# Altium footprint library Connectors.PcbLib: 135 footprints (part 6 of 9)
Each footprint in its own frame and in the unit in brackets; x right, y up, seen from the top. Pads: shape width x height; smd on the part's side, far side on the other; paste and mask are expansions set on the pad; w line width, h text height; cw(c..) or ccw(c..) is an arc to the next point about the centre after c.
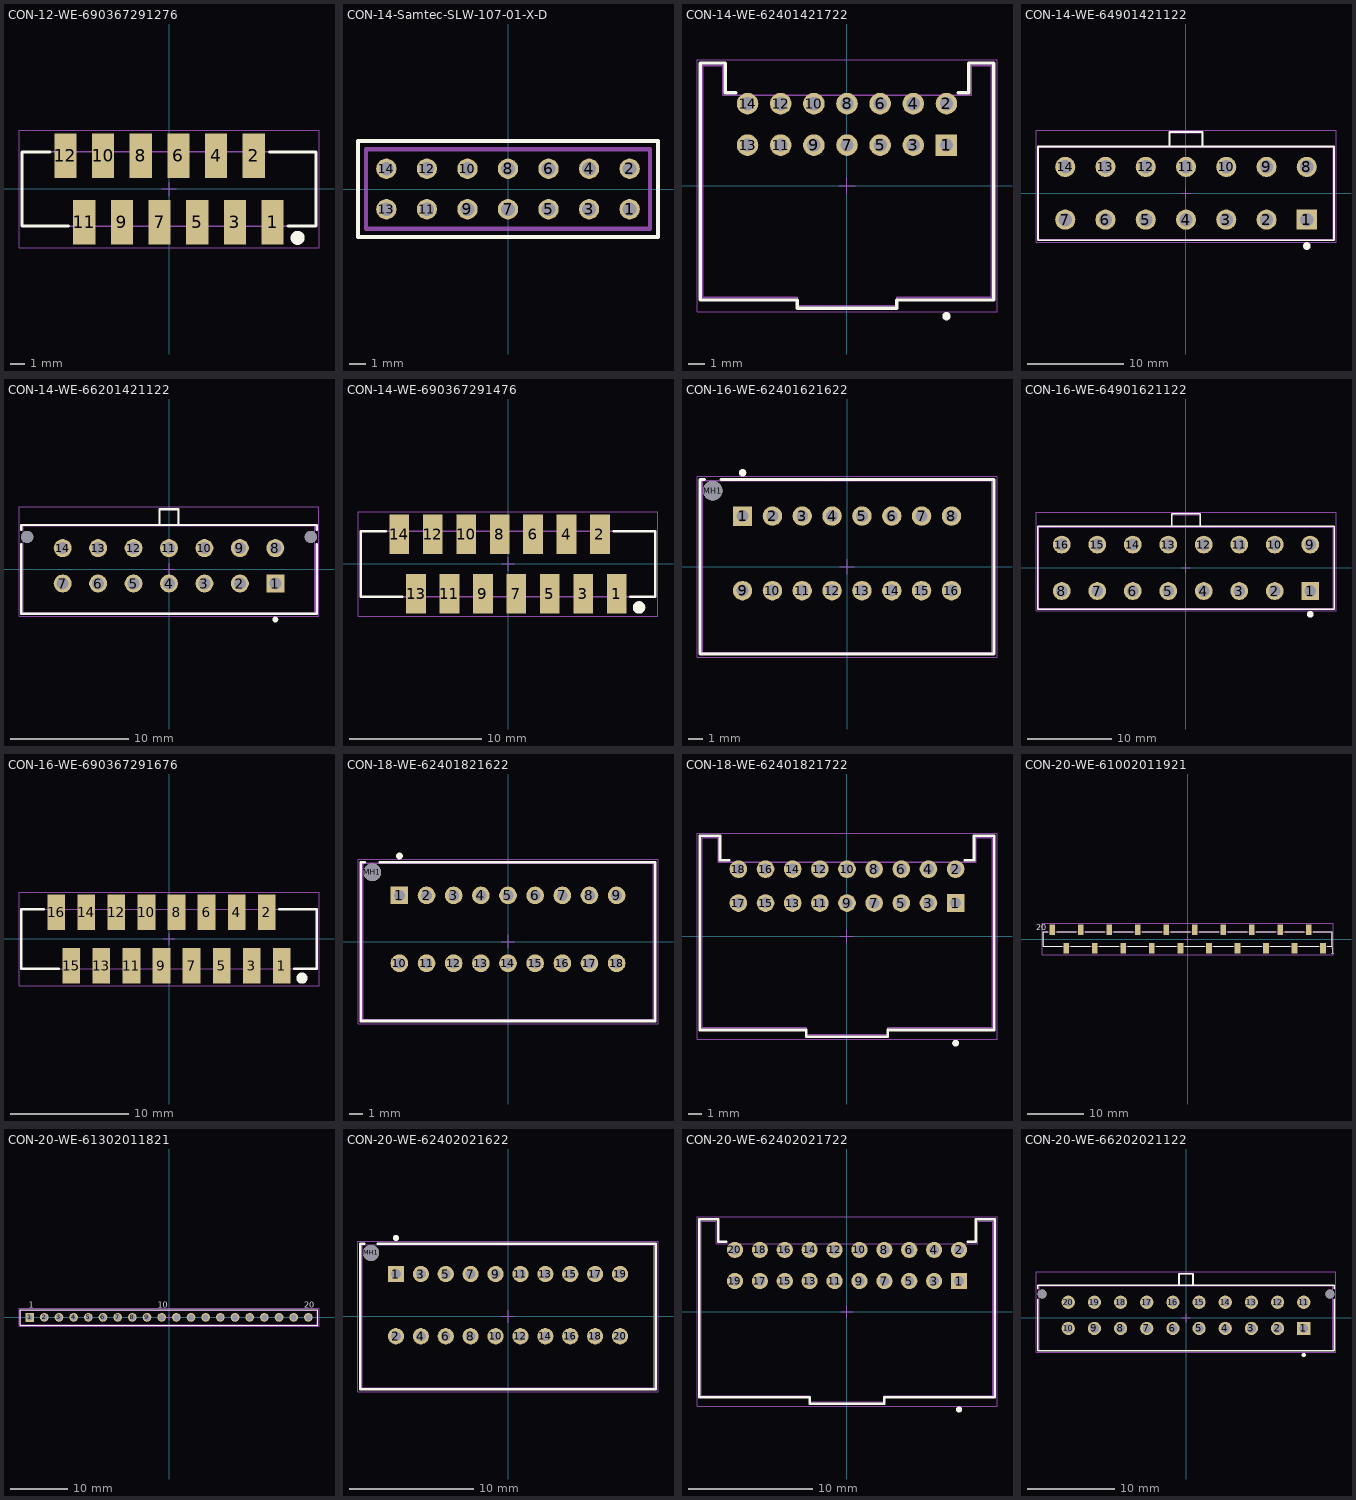
[diagram p5: the footprints below, top view; thin cyan lines are the x and y axes]

## CON-12-WE-690367291276 [mm] "MiniModule Connectors, PCB Type, Female, SMT, Vertical, 12p"
height 5.45
pads (12):
  rect 1.5x3 smd: 1(6.985,-2.25) 2(5.715,2.25) 3(4.445,-2.25) 4(3.175,2.25) 5(1.905,-2.25) 6(0.635,2.25) 7(-0.635,-2.25) 8(-1.905,2.25) 9(-3.175,-2.25) 10(-4.445,2.25) 11(-5.715,-2.25) 12(-6.985,2.25)
Top Overlay:
  circle w0.5: c8.68,-3.3 r0.224
  lines w0.2: -8.03,2.5 -9.92,2.5 -9.92,-2.5 -6.78,-2.5 ; 6.78,2.5 9.92,2.5 9.92,-2.5 8.03,-2.5
Top Component Center:
  lines w0.05: -0.5,0 0.5,0 ; 0,-0.5 0,0.5
Top Component Outline:
  lines w0.1: -9.92,-2.5 -9.92,2.5 9.92,2.5 9.92,-2.5 -9.92,-2.5
Top Courtyard (Mech26):
  lines w0.05: -10.12,-3.95 -10.12,3.95 10.12,3.95 10.12,-3.95 -10.12,-3.95
3D body "690367291276.stp": height 5.75, standoff 0, extent -9.915,-3.498 9.915,3.499

## CON-14-Samtec-SLW-107-01-X-D [mil]
pads (14):
  round 50 hole 34 mask+3: 1(300,-50) 2(300,50) 3(200,-50) 4(200,50) 5(100,-50) 6(100,50) 7(0,-50) 8(0,50) 9(-100,-50) 10(-100,50) 11(-200,-50) 12(-200,50) 13(-300,-50) 14(-300,50)
Top Overlay:
  lines w10: -370,-118 370,-118 370,118 -370,118 -370,-118
Top Component Outline:
  lines w10: -350,-98 -350,98 350,98 350,-98 -350,-98
3D body "SLW-107-01-F-D.stp": height 180, standoff -115, extent -350,-95.5 350,99.5

## CON-14-WE-62401421722 [mm] "2.00mm Male Dual Row Horizontal Shrouded Header with positive locking, 14p"
height 11.7
pads (14):
  rect 1.3x1.3 hole 0.8: 1(6,2.45)
  round 1.3 hole 0.8: 2(6,4.95) 3(4,2.45) 4(4,4.95) 5(2,2.45) 6(2,4.95) 7(0,2.45) 8(0,4.95) 9(-2,2.45) 10(-2,4.95) 11(-4,2.45) 12(-4,4.95) 13(-6,2.45) 14(-6,4.95)
Top Overlay:
  circle w0.25: c6,-7.875 r0.125
  lines w0.2: -6.7,5.6 -7.35,5.6 -7.35,7.4 -8.85,7.4 -8.85,-6.9 -3,-6.9 -3,-7.4 3,-7.4 3,-6.9 8.85,-6.9 8.85,7.4 7.35,7.4 7.35,5.6 6.7,5.6
Top Component Center:
  lines w0.05: -0.5,0 0.5,0 ; 0,-0.5 0,0.5
Top Component Outline:
  lines w0.1: -8.7,-6.75 -3,-6.75 -3,-7.25 3,-7.25 3,-6.75 8.7,-6.75 8.7,7.25 7.5,7.25 7.5,5.45 -7.5,5.45 -7.5,7.25 -8.7,7.25 -8.7,-6.75
Top Courtyard (Mech26):
  lines w0.05: -9.05,-7.6 -9.05,7.6 9.05,7.6 9.05,-7.6 -9.05,-7.6
3D body "62401421722.stp": height 11.73, standoff -3.17, extent -8.7,-7.25 8.7,7.25

## CON-14-WE-64901421122 [mm] "4.20mm Male Dual Row Vertical Header, 14p"
height 12.8
pads (14):
  rect 2.1x2.1 hole 1.4: 1(12.6,-2.75)
  round 2.1 hole 1.4: 2(8.4,-2.75) 3(4.2,-2.75) 4(0,-2.75) 5(-4.2,-2.75) 6(-8.4,-2.75) 7(-12.6,-2.75) 8(12.6,2.75) 9(8.4,2.75) 10(4.2,2.75) 11(0,2.75) 12(-4.2,2.75) 13(-8.4,2.75) 14(-12.6,2.75)
Top Overlay:
  circle w0.4: c12.6,-5.5 r0.2
  lines w0.2: -1.7,4.9 -1.7,6.4 1.7,6.4 1.7,4.9 ; -15.45,-4.9 15.45,-4.9 15.45,4.9 -15.45,4.9 -15.45,-4.9
Top Component Center:
  lines w0.05: -0.5,0 0.5,0 ; 0,-0.5 0,0.5
Top Component Outline:
  lines w0.1: -1.7,4.8 -1.7,6.3 1.7,6.3 1.7,4.8 ; -15.35,-4.8 -15.35,4.8 15.35,4.8 15.35,-4.8 -15.35,-4.8
Top Courtyard (Mech26):
  lines w0.05: -15.65,-5.1 -15.65,6.6 15.65,6.6 15.65,-5.1 -15.65,-5.1
3D body "64901421122.stp": height 12.82, standoff -3.48, extent -15.35,-4.8 15.65,6.3

## CON-14-WE-66201421122 [mm] "Dual row Vertical header 14p"
height 9.9
pads (16):
  rect 1.52x1.52 hole 1.02: 1(9,-1.2)
  round 1.52 hole 1.02: 2(6,-1.2) 3(3,-1.2) 4(0,-1.2) 5(-3,-1.2) 6(-6,-1.2) 7(-9,-1.2) 8(9,1.8) 9(6,1.8) 10(3,1.8) 11(0,1.8) 12(-3,1.8) 13(-6,1.8) 14(-9,1.8)
  round 1.02 hole 1.02 unplated: MH1(-12,2.74) MH2(12,2.74)
Top Overlay:
  circle w0.25: c9,-4.25 r0.125
  lines w0.2: -12.5,2.145 -12.5,-3.755 12.5,-3.755 12.5,2.145 ; -12.5,3.345 -12.5,3.755 12.5,3.755 12.5,3.345 ; -0.8,3.755 -0.8,5.08 0.8,5.08 0.8,3.755
Top Component Center:
  lines w0.05: -0.5,0 0.5,0 ; 0,-0.5 0,0.5
Top Component Outline:
  lines w0.1: -0.8,3.68 -0.8,5.08 0.8,5.08 0.8,3.68 ; -12.35,-3.68 12.35,-3.68 12.35,3.68 -12.35,3.68 -12.35,-3.68
Top Courtyard (Mech26):
  lines w0.05: -12.7,-3.955 -12.7,5.28 12.7,5.28 12.7,-3.955 -12.7,-3.955
3D body "66201421122.stp": height 9.93, standoff -3.17, extent -12.35,-3.68 12.35,5.08

## CON-14-WE-690367291476 [mm] "MiniModule Connectors, PCB Type, Female, SMT, Vertical, 14p"
height 5.45
pads (14):
  rect 1.5x3 smd: 1(8.255,-2.25) 2(6.985,2.25) 3(5.715,-2.25) 4(4.445,2.25) 5(3.175,-2.25) 6(1.905,2.25) 7(0.635,-2.25) 8(-0.635,2.25) 9(-1.905,-2.25) 10(-3.175,2.25) 11(-4.445,-2.25) 12(-5.715,2.25) 13(-6.985,-2.25) 14(-8.255,2.25)
Top Overlay:
  circle w0.5: c9.95,-3.3 r0.224
  lines w0.2: -9.3,2.5 -11.19,2.5 -11.19,-2.5 -8.05,-2.5 ; 8.05,2.5 11.19,2.5 11.19,-2.5 9.3,-2.5
Top Component Center:
  lines w0.05: -0.5,0 0.5,0 ; 0,-0.5 0,0.5
Top Component Outline:
  lines w0.1: -11.19,-2.5 11.19,-2.5 11.19,2.5 -11.19,2.5 -11.19,-2.5
Top Courtyard (Mech26):
  lines w0.05: -11.39,-3.95 11.39,-3.95 11.39,3.95 -11.39,3.95 -11.39,-3.95
3D body "690367291476.stp": height 5.75, standoff 0, extent -11.185,-3.498 11.185,3.499

## CON-16-WE-62401621622 [mm] "2.00mm Male Dual Row Vertical Shrouded Header with positive locking, 16p"
height 11.6
pads (17):
  rect 1.3x1.3 hole 0.8: 1(-7,3.4)
  round 1.3 hole 0.8: 2(-5,3.4) 3(-3,3.4) 4(-1,3.4) 5(1,3.4) 6(3,3.4) 7(5,3.4) 8(7,3.4) 9(-7,-1.6) 10(-5,-1.6) 11(-3,-1.6) 12(-1,-1.6) 13(1,-1.6) 14(3,-1.6) 15(5,-1.6) 16(7,-1.6)
  round 1.3 hole 1.3 unplated: MH1(-9,5.1)
Top Overlay:
  circle w0.25: c-7,6.3 r0.125
  lines w0.2: -9.55,5.85 -9.85,5.85 -9.85,-5.85 9.85,-5.85 9.85,5.85 -8.45,5.85
Top Component Center:
  lines w0.05: -0.5,0 0.5,0 ; 0,-0.5 0,0.5
Top Component Outline:
  lines w0.1: -9.7,-5.75 -9.7,5.75 ; -9.7,-5.75 9.7,-5.75 9.7,5.75 -9.7,5.75 ; -9.7,-5.75 -9.7,5.75
Top Courtyard (Mech26):
  lines w0.05: -10.05,-6.05 10.05,-6.05 10.05,6.05 -10.05,6.05 -10.05,-6.05
3D body "62401621622.stp": height 9.78, standoff -3.17, extent -9.7,-5.75 9.7,5.75

## CON-16-WE-64901621122 [mm] "4.20mm Male Dual Row Vertical Header, 16p"
height 12.8
pads (16):
  rect 2.1x2.1 hole 1.4: 1(14.7,-2.75)
  round 2.1 hole 1.4: 2(10.5,-2.75) 3(6.3,-2.75) 4(2.1,-2.75) 5(-2.1,-2.75) 6(-6.3,-2.75) 7(-10.5,-2.75) 8(-14.7,-2.75) 9(14.7,2.75) 10(10.5,2.75) 11(6.3,2.75) 12(2.1,2.75) 13(-2.1,2.75) 14(-6.3,2.75) 15(-10.5,2.75) 16(-14.7,2.75)
Top Overlay:
  circle w0.4: c14.7,-5.5 r0.2
  lines w0.2: -1.7,4.9 -1.7,6.4 1.7,6.4 1.7,4.9 ; -17.55,-4.9 17.55,-4.9 17.55,4.9 -17.55,4.9 -17.55,-4.9
Top Component Center:
  lines w0.05: -0.5,0 0.5,0 ; 0,-0.5 0,0.5
Top Component Outline:
  lines w0.1: -1.7,4.8 -1.7,6.3 1.7,6.3 1.7,4.8 ; -17.45,-4.8 -17.45,4.8 17.45,4.8 17.45,-4.8 -17.45,-4.8
Top Courtyard (Mech26):
  lines w0.05: -17.75,-5.1 -17.75,6.6 17.75,6.6 17.75,-5.1 -17.75,-5.1
3D body "64901621122.stp": height 12.82, standoff -3.48, extent -17.45,-4.8 17.75,6.3

## CON-16-WE-690367291676 [mm] "MiniModule Connectors, PCB Type, Female, SMT, Vertical, 16p"
height 5.45
pads (16):
  rect 1.5x3 smd: 1(9.525,-2.25) 2(8.255,2.25) 3(6.985,-2.25) 4(5.715,2.25) 5(4.445,-2.25) 6(3.175,2.25) 7(1.905,-2.25) 8(0.635,2.25) 9(-0.635,-2.25) 10(-1.905,2.25) 11(-3.175,-2.25) 12(-4.445,2.25) 13(-5.715,-2.25) 14(-6.985,2.25) 15(-8.255,-2.25) 16(-9.525,2.25)
Top Overlay:
  circle w0.5: c11.22,-3.3 r0.224
  lines w0.2: -10.57,2.5 -12.46,2.5 -12.46,-2.5 -9.32,-2.5 ; 9.32,2.5 12.46,2.5 12.46,-2.5 10.57,-2.5
Top Component Center:
  lines w0.05: -0.5,0 0.5,0 ; 0,-0.5 0,0.5
Top Component Outline:
  lines w0.1: -12.46,-2.5 12.46,-2.5 12.46,2.5 -12.46,2.5 -12.46,-2.5
Top Courtyard (Mech26):
  lines w0.05: -12.66,-3.95 12.66,-3.95 12.66,3.95 -12.66,3.95 -12.66,-3.95
3D body "690367291676.stp": height 5.75, standoff 0, extent -12.455,-3.498 12.455,3.499

## CON-18-WE-62401821622 [mm] "2.00mm Male Dual Row Vertical Shrouded Header with positive locking, 18p"
height 11.6
pads (19):
  rect 1.3x1.3 hole 0.8: 1(-8,3.4)
  round 1.3 hole 0.8: 2(-6,3.4) 3(-4,3.4) 4(-2,3.4) 5(0,3.4) 6(2,3.4) 7(4,3.4) 8(6,3.4) 9(8,3.4) 10(-8,-1.6) 11(-6,-1.6) 12(-4,-1.6) 13(-2,-1.6) 14(0,-1.6) 15(2,-1.6) 16(4,-1.6) 17(6,-1.6) 18(8,-1.6)
  round 1.3 hole 1.3 unplated: MH1(-10,5.1)
Top Overlay:
  circle w0.25: c-8,6.3 r0.125
  lines w0.2: -10.55,5.85 -10.85,5.85 -10.85,-5.85 10.85,-5.85 10.85,5.85 -9.45,5.85
Top Component Center:
  lines w0.05: -0.5,0 0.5,0 ; 0,-0.5 0,0.5
Top Component Outline:
  lines w0.1: -10.7,-5.75 -10.7,5.75 ; -10.7,-5.75 10.7,-5.75 10.7,5.75 -10.7,5.75 ; -10.7,-5.75 -10.7,5.75
Top Courtyard (Mech26):
  lines w0.05: -11.05,-6.05 -11.05,6.05 11.05,6.05 11.05,-6.05 -11.05,-6.05
3D body "62401821622.stp": height 9.78, standoff -3.17, extent -10.7,-5.75 10.7,5.75

## CON-18-WE-62401821722 [mm] "2.00mm Male Dual Row Horizontal Shrouded Header with positive locking, 18p"
height 11.7
pads (18):
  rect 1.3x1.3 hole 0.8: 1(8,2.45)
  round 1.3 hole 0.8: 2(8,4.95) 3(6,2.45) 4(6,4.95) 5(4,2.45) 6(4,4.95) 7(2,2.45) 8(2,4.95) 9(0,2.45) 10(0,4.95) 11(-2,2.45) 12(-2,4.95) 13(-4,2.45) 14(-4,4.95) 15(-6,2.45) 16(-6,4.95) 17(-8,2.45) 18(-8,4.95)
Top Overlay:
  circle w0.25: c8,-7.875 r0.125
  lines w0.2: -8.7,5.6 -9.35,5.6 -9.35,7.4 -10.85,7.4 -10.85,-6.9 -3,-6.9 -3,-7.4 3,-7.4 3,-6.9 10.85,-6.9 10.85,7.4 9.35,7.4 9.35,5.6 8.7,5.6
Top Component Center:
  lines w0.05: -0.5,0 0.5,0 ; 0,-0.5 0,0.5
Top Component Outline:
  lines w0.1: -10.7,-6.75 -3,-6.75 -3,-7.25 3,-7.25 3,-6.75 10.7,-6.75 10.7,7.25 9.5,7.25 9.5,5.45 -9.5,5.45 -9.5,7.25 -10.7,7.25 -10.7,-6.75
Top Courtyard (Mech26):
  lines w0.05: -11.05,-7.6 11.05,-7.6 11.05,7.6 -11.05,7.6 -11.05,-7.6
3D body "62401821722.stp": height 11.73, standoff -3.17, extent -10.7,-7.25 10.7,7.25

## CON-20-WE-61002011921 [mm] "Socket Header, Pitch 2.54 mm, SMT, Vertical, single row, 20p"
height 7.5
pads (20):
  rect 1x1.91 smd: 1(24.13,-1.645) 2(21.59,1.645) 3(19.05,-1.645) 4(16.51,1.645) 5(13.97,-1.645) 6(11.43,1.645) 7(8.89,-1.645) 8(6.35,1.645) 9(3.81,-1.645) 10(1.27,1.645) 11(-1.27,-1.645) 12(-3.81,1.645) 13(-6.35,-1.645) 14(-8.89,1.645) 15(-11.43,-1.645) 16(-13.97,1.645) 17(-16.51,-1.645) 18(-19.05,1.645) 19(-21.59,-1.645) 20(-24.13,1.645)
Top Overlay:
  lines w0.2: -24.92,1.325 -25.725,1.325 -25.725,-1.325 -22.36,-1.325 ; -23.34,1.325 -19.82,1.325 ; -20.82,-1.325 -17.3,-1.325 ; -18.26,1.325 -14.74,1.325 ; -15.74,-1.325 -12.22,-1.325 ; -13.18,1.325 -9.66,1.325 ; -10.66,-1.325 -7.14,-1.325 ; -8.1,1.325 -4.58,1.325 ; -5.58,-1.325 -2.06,-1.325 ; -3.02,1.325 0.5,1.325 ; -0.5,-1.325 3.02,-1.325 ; 2.06,1.325 5.58,1.325 ; 4.58,-1.325 8.1,-1.325 ; 7.14,1.325 10.66,1.325 ; 9.66,-1.325 13.18,-1.325 ; 12.22,1.325 15.74,1.325 ; 14.74,-1.325 18.26,-1.325 ; 17.3,1.325 20.82,1.325 ; 19.82,-1.325 23.34,-1.325 ; 22.36,1.325 25.725,1.325 25.725,-1.325 24.92,-1.325
  text "1" at 25.42,-2.6 h1.02
  text "20" at -27,1.6 h1.02
Top Component Center:
  lines w0.05: -0.5,0 0.5,0 ; 0,-0.5 0,0.5
Top Component Outline:
  lines w0.1: -24.38,1.25 -24.38,2.025 -23.88,2.025 -23.88,1.25 ; -21.84,-1.25 -21.84,-2.025 -21.34,-2.025 -21.34,-1.25 ; -19.3,1.25 -19.3,2.025 -18.8,2.025 -18.8,1.25 ; -16.76,-1.25 -16.76,-2.025 -16.26,-2.025 -16.26,-1.25 ; -14.22,1.25 -14.22,2.025 -13.72,2.025 -13.72,1.25 ; -11.68,-1.25 -11.68,-2.025 -11.18,-2.025 -11.18,-1.25 ; -9.14,1.25 -9.14,2.025 -8.64,2.025 -8.64,1.25 ; -6.6,-1.25 -6.6,-2.025 -6.1,-2.025 -6.1,-1.25 ; -4.06,1.25 -4.06,2.025 -3.56,2.025 -3.56,1.25 ; -1.52,-1.25 -1.52,-2.025 -1.02,-2.025 -1.02,-1.25 ; 1.02,1.25 1.02,2.025 1.52,2.025 1.52,1.25 ; 3.56,-1.25 3.56,-2.025 4.06,-2.025 4.06,-1.25 ; 6.1,1.25 6.1,2.025 6.6,2.025 6.6,1.25 ; 8.64,-1.25 8.64,-2.025 9.14,-2.025 9.14,-1.25 ; 11.18,1.25 11.18,2.025 11.68,2.025 11.68,1.25 ; 13.72,-1.25 13.72,-2.025 14.22,-2.025 14.22,-1.25 ; 16.26,1.25 16.26,2.025 16.76,2.025 16.76,1.25 ; 18.8,-1.25 18.8,-2.025 19.3,-2.025 19.3,-1.25 ; 21.34,1.25 21.34,2.025 21.84,2.025 21.84,1.25 ; 23.88,-1.25 23.88,-2.025 24.38,-2.025 24.38,-1.25 ; -25.65,-1.25 -25.65,1.25 25.65,1.25 25.65,-1.25 -25.65,-1.25
Top Courtyard (Mech26):
  lines w0.05: -25.925,-2.8 -25.925,2.8 25.925,2.8 25.925,-2.8 -25.925,-2.8
3D body "61002011921.stp": height 7.5, standoff 0, extent -25.65,-2.025 25.65,2.025

## CON-20-WE-61302011821 [mm] "Socket Header, Pitch 2.54 mm, THT, Vertical, single row, 20p"
height 8.5
pads (20):
  rect 1.52x1.52 hole 1.02: 1(-24.13,0)
  round 1.52 hole 1.02: 2(-21.59,0) 3(-19.05,0) 4(-16.51,0) 5(-13.97,0) 6(-11.43,0) 7(-8.89,0) 8(-6.35,0) 9(-3.81,0) 10(-1.27,0) 11(1.27,0) 12(3.81,0) 13(6.35,0) 14(8.89,0) 15(11.43,0) 16(13.97,0) 17(16.51,0) 18(19.05,0) 19(21.59,0) 20(24.13,0)
Top Overlay:
  lines w0.2: -25.775,-1.35 25.775,-1.35 25.775,1.35 -25.775,1.35 -25.775,-1.35
  text "20" at 23.4,1.7 h1.02
  text "1" at -24.32,1.7 h1.02
  text "10" at -1.95,1.7 h1.02
Top Component Center:
  lines w0.05: -0.5,0 0.5,0 ; 0,-0.5 0,0.5
Top Component Outline:
  lines w0.1: -25.65,-1.25 -25.65,1.25 25.65,1.25 25.65,-1.25 -25.65,-1.25
Top Courtyard (Mech26):
  lines w0.05: -25.975,-1.55 -25.975,1.55 25.975,1.55 25.975,-1.55 -25.975,-1.55
3D body "61302011821.stp": height 8.55, standoff -3.06, extent -25.65,-1.25 25.65,1.25

## CON-20-WE-62402021622 [mm] "2.00mm Male Dual Row Vertical Shrouded Header with positive locking, 20p"
height 11.6
pads (21):
  rect 1.3x1.3 hole 0.8: 1(-9,3.4)
  round 1.3 hole 0.8: 2(-9,-1.6) 3(-7,3.4) 4(-7,-1.6) 5(-5,3.4) 6(-5,-1.6) 7(-3,3.4) 8(-3,-1.6) 9(-1,3.4) 10(-1,-1.6) 11(1,3.4) 12(1,-1.6) 13(3,3.4) 14(3,-1.6) 15(5,3.4) 16(5,-1.6) 17(7,3.4) 18(7,-1.6) 19(9,3.4) 20(9,-1.6)
  round 1.3 hole 1.3 unplated: MH1(-11,5.1)
Top Overlay:
  circle w0.25: c-9,6.3 r0.125
  lines w0.2: -11.55,5.85 -11.85,5.85 -11.85,-5.85 11.85,-5.85 11.85,5.85 -10.45,5.85
Top Component Center:
  lines w0.05: -0.5,0 0.5,0 ; 0,-0.5 0,0.5
Top Component Outline:
  lines w0.1: -11.7,-5.75 -11.7,5.75 ; -11.7,-5.75 -11.7,5.75 ; -11.7,-5.75 11.7,-5.75 11.7,5.75 -11.7,5.75
Top Courtyard (Mech26):
  lines w0.05: -12.05,-6.05 12.05,-6.05 12.05,6.05 -12.05,6.05 -12.05,-6.05
3D body "62402021622.stp": height 9.78, standoff -3.17, extent -11.7,-5.75 11.7,5.75

## CON-20-WE-62402021722 [mm] "2.00mm Male Dual Row Horizontal Shrouded Header with positive locking, 20p"
height 11.7
pads (20):
  rect 1.3x1.3 hole 0.8: 1(9,2.45)
  round 1.3 hole 0.8: 2(9,4.95) 3(7,2.45) 4(7,4.95) 5(5,2.45) 6(5,4.95) 7(3,2.45) 8(3,4.95) 9(1,2.45) 10(1,4.95) 11(-1,2.45) 12(-1,4.95) 13(-3,2.45) 14(-3,4.95) 15(-5,2.45) 16(-5,4.95) 17(-7,2.45) 18(-7,4.95) 19(-9,2.45) 20(-9,4.95)
Top Overlay:
  circle w0.25: c9,-7.875 r0.125
  lines w0.2: -9.7,5.6 -10.35,5.6 -10.35,7.4 -11.85,7.4 -11.85,-6.9 -3,-6.9 -3,-7.4 3,-7.4 3,-6.9 11.85,-6.9 11.85,7.4 10.35,7.4 10.35,5.6 9.7,5.6
Top 3D Body (Mech20):
  lines w0.1: -11.7,-6.75 -3,-6.75 -3,-7.25 3,-7.25 3,-6.75 11.7,-6.75 11.7,7.25 10.5,7.25 10.5,5.45 -10.5,5.45 -10.5,7.25 -11.7,7.25 -11.7,-6.75
Top Component Center:
  lines w0.05: -0.5,0 0.5,0 ; 0,-0.5 0,0.5
Top Courtyard (Mech26):
  lines w0.05: -12.05,-7.6 -12.05,7.6 12.05,7.6 12.05,-7.6 -12.05,-7.6
3D body "62402021722.stp": height 11.73, standoff -3.17, extent -11.7,-7.25 11.7,7.25

## CON-20-WE-66202021122 [mm] "Dual row Vertical header 20p"
height 9.9
pads (22):
  rect 1.52x1.52 hole 1.02: 1(13.5,-1.2)
  round 1.52 hole 1.02: 2(10.5,-1.2) 3(7.5,-1.2) 4(4.5,-1.2) 5(1.5,-1.2) 6(-1.5,-1.2) 7(-4.5,-1.2) 8(-7.5,-1.2) 9(-10.5,-1.2) 10(-13.5,-1.2) 11(13.5,1.8) 12(10.5,1.8) 13(7.5,1.8) 14(4.5,1.8) 15(1.5,1.8) 16(-1.5,1.8) 17(-4.5,1.8) 18(-7.5,1.8) 19(-10.5,1.8) 20(-13.5,1.8)
  round 1.02 hole 1.02 unplated: MH1(-16.5,2.74) MH2(16.5,2.74)
Top Overlay:
  circle w0.25: c13.5,-4.25 r0.125
  lines w0.2: -17,2.145 -17,-3.755 17,-3.755 17,2.145 ; -17,3.345 -17,3.755 17,3.755 17,3.345 ; -0.8,3.755 -0.8,5.08 0.8,5.08 0.8,3.755
Top Component Center:
  lines w0.05: -0.5,0 0.5,0 ; 0,-0.5 0,0.5
Top Component Outline:
  lines w0.1: -0.8,3.68 -0.8,5.08 0.8,5.08 0.8,3.68 ; -16.85,-3.68 16.85,-3.68 16.85,3.68 -16.85,3.68 -16.85,-3.68
Top Courtyard (Mech26):
  lines w0.05: -17.2,-3.955 -17.2,5.28 17.2,5.28 17.2,-3.955 -17.2,-3.955
3D body "66202021122.stp": height 9.93, standoff -3.17, extent -16.85,-3.68 16.85,5.08